# Altium footprint library HW_HOLLAND_NCDM_MONITOR_R1.PcbLib: 472 footprints (part 20 of 30)
Each footprint in its own frame and in the unit in brackets; x right, y up, seen from the top. Pads: shape width x height; smd on the part's side, far side on the other; paste and mask are expansions set on the pad; w line width, h text height; cw(c..) or ccw(c..) is an arc to the next point about the centre after c.
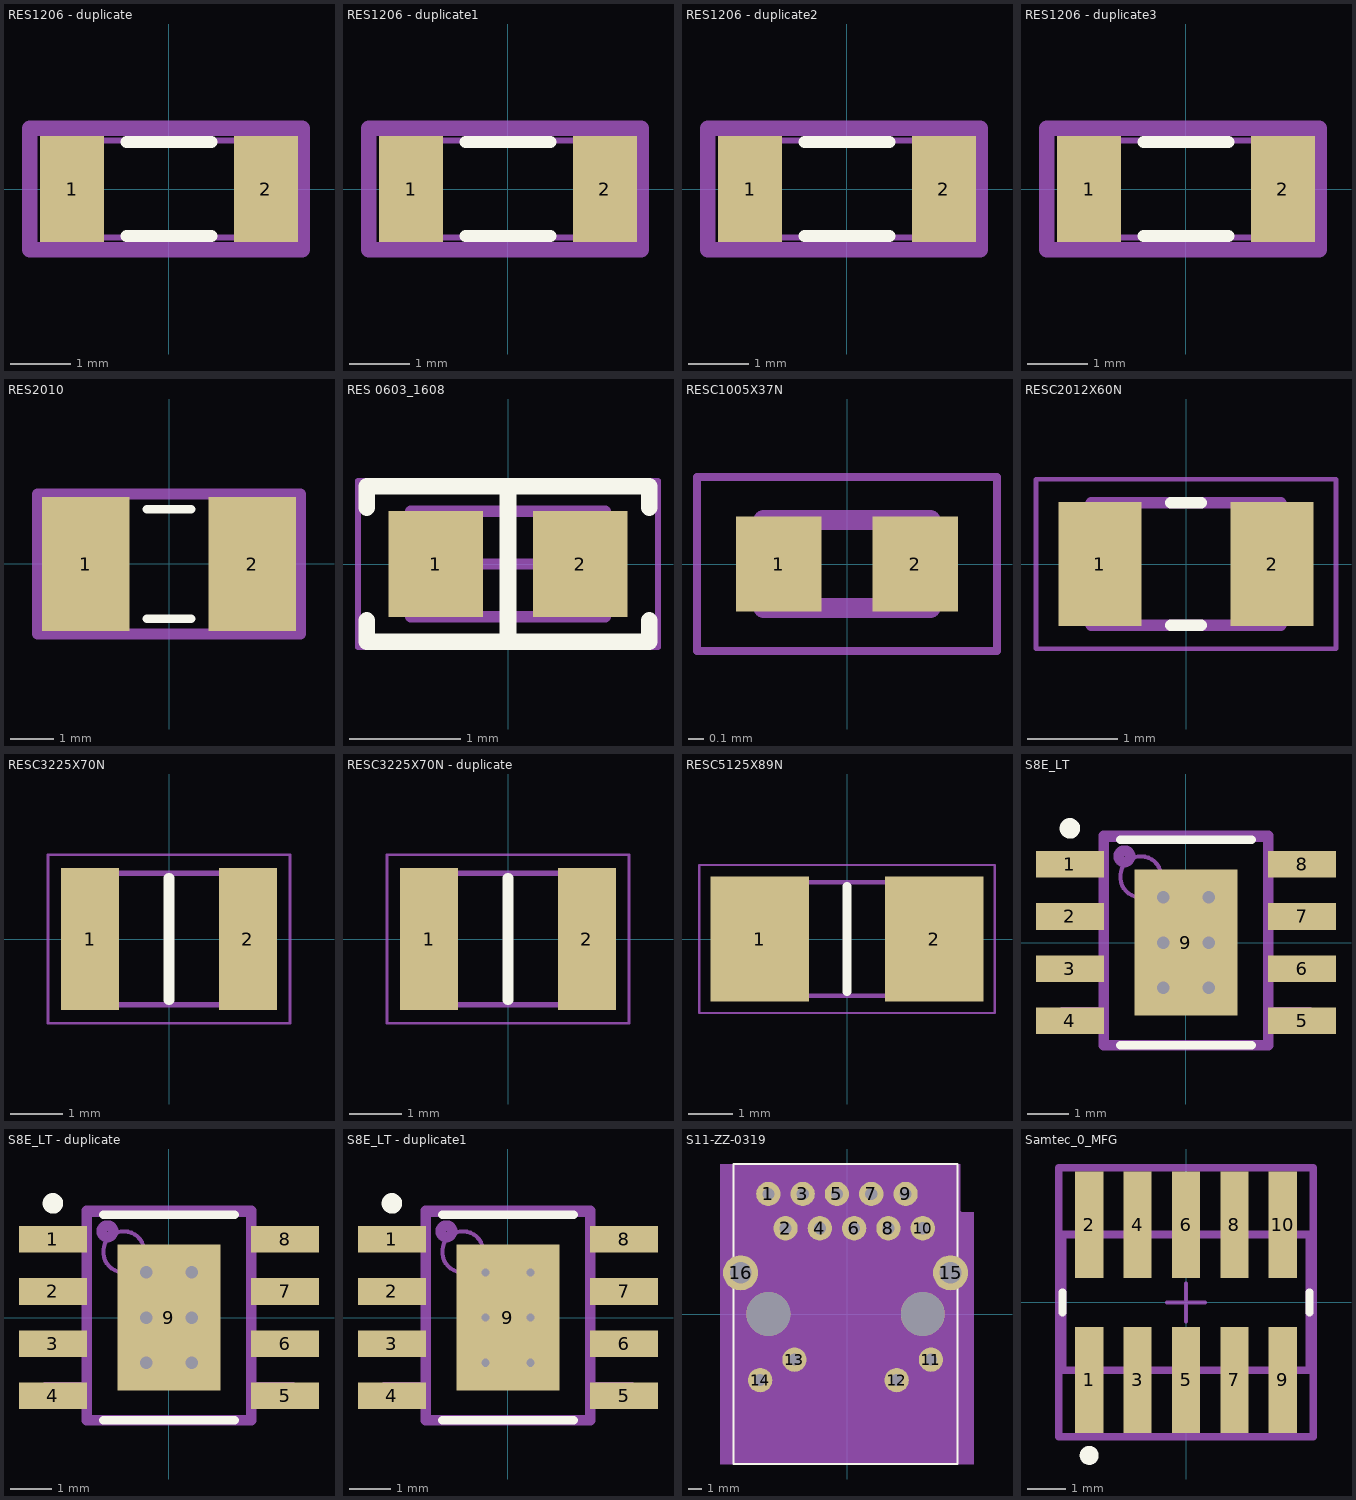
[diagram p19: the footprints below, top view; thin cyan lines are the x and y axes]

## RES1206 - duplicate [mm]
height 3.5
pads (2):
  rect 1.05x1.75 smd: 1(-1.6,0) 2(1.6,0)
Top Overlay:
  lines w0.2: -0.7,-0.775 0.7,-0.775 ; -0.7,0.775 0.7,0.775
Top 3D Body:
  lines w0.1: -1.55,-0.8 1.55,-0.8 1.55,0.8 -1.55,0.8 -1.55,-0.8
Top Designator:
  lines w0.254: -2.3,-1 2.2,-1 2.2,1 -2.3,1 -2.3,-1
  text ".Designator" at -5.078,-0.339 h1.02
3D body "RES1206.step": height 0.55, standoff 0, extent -1.55,-0.8 1.55,0.8

## RES1206 - duplicate1 [mm]
pads (2):
  rect 1.05x1.75 smd: 1(-1.6,0) 2(1.6,0)
Top Overlay:
  lines w0.2: -0.7,-0.775 0.7,-0.775 ; -0.7,0.775 0.7,0.775
Top 3D Body:
  lines w0.1: -1.55,-0.8 -1.55,0.8 1.55,0.8 1.55,-0.8 -1.55,-0.8
Top Designator:
  lines w0.254: -2.3,-1 -2.3,1 2.2,1 2.2,-1 -2.3,-1
  text ".Designator" at -5.078,-0.339 h1.02
3D body "RES1206.step": height 0.55, standoff 0, extent -1.55,-0.8 1.55,0.8

## RES1206 - duplicate2 [mm]
height 3.5
pads (2):
  rect 1.05x1.75 smd: 1(-1.6,0) 2(1.6,0)
Top Overlay:
  lines w0.2: -0.7,-0.775 0.7,-0.775 ; -0.7,0.775 0.7,0.775
Top 3D Body:
  lines w0.1: -1.55,-0.8 1.55,-0.8 1.55,0.8 -1.55,0.8 -1.55,-0.8
Top Designator:
  lines w0.254: -2.3,-1 2.2,-1 2.2,1 -2.3,1 -2.3,-1
  text ".Designator" at -5.078,-0.339 h1.02
3D body "RES1206.step": height 0.55, standoff 0, extent -1.55,-0.8 1.55,0.8

## RES1206 - duplicate3 [mm]
pads (2):
  rect 1.05x1.75 smd: 1(-1.6,0) 2(1.6,0)
Top Overlay:
  lines w0.2: -0.7,-0.775 0.7,-0.775 ; -0.7,0.775 0.7,0.775
Top 3D Body:
  lines w0.1: -1.55,-0.8 -1.55,0.8 1.55,0.8 1.55,-0.8 -1.55,-0.8
Top Designator:
  lines w0.254: -2.3,-1 -2.3,1 2.2,1 2.2,-1 -2.3,-1
  text ".Designator" at -2.812,-0.282 h1.25
3D body "RES1206.step": height 0.55, standoff 0, extent -1.55,-0.8 1.55,0.8

## RES2010 [mm]
pads (2):
  rect 2x3.05 smd: 1(-1.9,0) 2(1.9,0)
Top Overlay:
  lines w0.2: -0.5,-1.25 0.5,-1.25 ; -0.5,1.25 0.5,1.25
Top Designator:
  lines w0.254: -3,-1.6 3,-1.6 3,1.6 -3,1.6 -3,-1.6
  text ".Designator" at -2.812,-0.282 h1.25
3D body "WSLP2010 (0.001 to 0.0069).STEP": height 0.66, standoff 0, extent -2.54,-1.27 2.54,1.27

## RES 0603_1608 [mm] "Chip Resistor, 2-Leads, Body 1.60x0.80mm, IPC Medium Density"
height 0.45
pads (2):
  rect 0.85x0.95 smd: 1(-0.65,0) 2(0.65,0)
Top Overlay:
  lines w0.15: -1.27,-0.508 -1.27,-0.7 1.27,-0.7 1.27,-0.508 ; -1.27,0.508 -1.27,0.7 1.27,0.7 1.27,0.508 ; 0,-0.7 0,0.7
Mechanical 13:
  lines w0.1: -0.875,-0.475 0.875,-0.475 0.875,0.475 -0.875,0.475 -0.875,-0.475
Mechanical 15:
  lines w0.05: -1.35,-0.75 1.35,-0.75 1.35,0.75 -1.35,0.75 -1.35,-0.75
  lines w0.1: -0.475,0 0.475,0 ; 0,-0.475 0,0.475
3D body "0603 resistor.STEP": height 0.45, standoff 0, extent -0.8,-0.4 0.8,0.4

## RESC1005X37N [mm]
pads (2):
  rect 0.54x0.6 smd: 1(-0.432,0) 2(0.432,0)
Mechanical 13:
  lines w0.127: -0.53,-0.28 -0.53,0.28 0.53,0.28 0.53,-0.28 -0.53,-0.28
Mechanical 15:
  lines w0.05: -0.95,-0.55 -0.95,0.55 0.95,0.55 0.95,-0.55 -0.95,-0.55
3D body "step_temp.STEP": height 0.37, standoff 0, extent -0.5,-0.25 0.5,0.25

## RESC2012X60N [mm]
pads (2):
  rect 0.92x1.38 smd: 1(-0.955,0) 2(0.955,0)
Top Overlay:
  lines w0.127: -0.17,-0.68 0.17,-0.68 ; -0.17,0.68 0.17,0.68
Mechanical 13:
  lines w0.127: -1.05,-0.68 -1.05,0.68 1.05,0.68 1.05,-0.68 -1.05,-0.68
Mechanical 15:
  lines w0.05: -1.665,-0.94 -1.665,0.94 1.665,0.94 1.665,-0.94 -1.665,-0.94
3D body "RT0805BRD0711K7L.STEP": height 0.61, standoff 0.01, extent -1,-0.625 1,0.625

## RESC3225X70N [mm]
pads (2):
  rect 1.1x2.7 smd: 1(-1.5,0) 2(1.5,0)
Top Overlay:
  lines w0.2: 0,-1.15 0,1.15
Mechanical 13:
  lines w0.1: -1.6,-1.25 -1.6,1.25 1.6,1.25 1.6,-1.25 -1.6,-1.25
Mechanical 15:
  lines w0.05: -2.3,-1.6 -2.3,1.6 2.3,1.6 2.3,-1.6 -2.3,-1.6
3D body "CRCW12100000Z0EAHP.stp": height 0.7, standoff 0, extent -1.6,-1.25 1.6,1.25

## RESC3225X70N - duplicate [mm]
pads (2):
  rect 1.1x2.7 smd: 1(-1.5,0) 2(1.5,0)
Top Overlay:
  lines w0.2: 0,-1.15 0,1.15
Mechanical 13:
  lines w0.1: -1.6,-1.25 -1.6,1.25 1.6,1.25 1.6,-1.25 -1.6,-1.25
Mechanical 15:
  lines w0.05: -2.3,-1.6 -2.3,1.6 2.3,1.6 2.3,-1.6 -2.3,-1.6
3D body "CRCW12100000Z0EAHP.stp": height 0.7, standoff 0, extent -1.6,-1.25 1.6,1.25

## RESC5125X89N [mm]
pads (2):
  rect 2.2x2.8 smd: 1(-1.95,0) 2(1.95,0)
Top Overlay:
  lines w0.2: 0,-1.17 0,1.17
Mechanical 13:
  lines w0.1: -2.54,-1.27 2.54,-1.27 2.54,1.27 -2.54,1.27 -2.54,-1.27
Mechanical 15:
  lines w0.05: -3.3,-1.65 3.3,-1.65 3.3,1.65 -3.3,1.65 -3.3,-1.65
3D body "WSLP20102L500FEA.stp": height 0.67, standoff 0.01, extent -2.54,-1.27 2.54,1.27

## S8E_LT [mm]
pads (9):
  rect 1.65x0.65 smd: 1(-2.825,1.905) 2(-2.825,0.635) 3(-2.825,-0.635) 4(-2.825,-1.905) 5(2.825,-1.905) 6(2.825,-0.635) 7(2.825,0.635) 8(2.825,1.905)
  rect 2.5x3.55 smd: 9(0,0)
via 0.55,-1.1 diameter 0.508 hole 0.305
via -0.55,-1.1 diameter 0.508 hole 0.305
via 0.55,0 diameter 0.508 hole 0.305
via -0.55,0 diameter 0.508 hole 0.305
via 0.55,1.1 diameter 0.508 hole 0.305
via -0.55,1.1 diameter 0.508 hole 0.305
Top Overlay:
  circle w0.25: c-2.825,2.78 r0.125
  lines w0.2: -1.6,-2.5 1.6,-2.5 ; -1.6,2.5 1.6,2.5
Top 3D Body:
  circle w0.1: c-1.1,1.6 r0.5
  lines w0.1: -2,-2.5 2,-2.5 2,2.5 -2,2.5 -2,-2.5
Top Designator:
  circle w0.254: c-1.5,2.1 r0.141
  lines w0.254: -2,-2 -3,-2 -3,-1.7 -2,-1.7 ; -2,-0.8 -3,-0.8 -3,-0.5 -2,-0.5 ; -2,0.5 -3,0.5 -3,0.8 -2,0.8 ; -2,1.8 -3,1.8 -3,2.1 -2,2.1 ; 2,-2 3,-2 3,-1.7 2,-1.7 ; 2,-0.8 3,-0.8 3,-0.5 2,-0.5 ; 2,0.5 3,0.5 3,0.8 2,0.8 ; 2,1.8 3,1.8 3,2.1 2,2.1 ; -2,-2.5 -2,2.6 2,2.6 2,-2.5 -2,-2.5
  text ".Designator" at -0.423,6.348 h1.27
3D body "SOIC8-150-50.STEP": height 1.91, standoff 0, extent -3,-2.45 3,2.45

## S8E_LT - duplicate [mm]
pads (9):
  rect 1.65x0.65 smd: 1(-2.825,1.905) 2(-2.825,0.635) 3(-2.825,-0.635) 4(-2.825,-1.905) 5(2.825,-1.905) 6(2.825,-0.635) 7(2.825,0.635) 8(2.825,1.905)
  rect 2.5x3.55 smd: 9(0,0)
via 0.55,-1.1 diameter 0.508 hole 0.305
via -0.55,-1.1 diameter 0.508 hole 0.305
via 0.55,0 diameter 0.508 hole 0.305
via -0.55,0 diameter 0.508 hole 0.305
via 0.55,1.1 diameter 0.508 hole 0.305
via -0.55,1.1 diameter 0.508 hole 0.305
Top Overlay:
  circle w0.25: c-2.825,2.78 r0.125
  lines w0.2: -1.6,-2.5 1.6,-2.5 ; -1.6,2.5 1.6,2.5
Top 3D Body:
  circle w0.1: c-1.1,1.6 r0.5
  lines w0.1: -2,-2.5 2,-2.5 2,2.5 -2,2.5 -2,-2.5
Top Designator:
  circle w0.254: c-1.5,2.1 r0.141
  lines w0.254: -2,-2 -3,-2 -3,-1.7 -2,-1.7 ; -2,-0.8 -3,-0.8 -3,-0.5 -2,-0.5 ; -2,0.5 -3,0.5 -3,0.8 -2,0.8 ; -2,1.8 -3,1.8 -3,2.1 -2,2.1 ; 2,-2 3,-2 3,-1.7 2,-1.7 ; 2,-0.8 3,-0.8 3,-0.5 2,-0.5 ; 2,0.5 3,0.5 3,0.8 2,0.8 ; 2,1.8 3,1.8 3,2.1 2,2.1 ; -2,-2.5 -2,2.6 2,2.6 2,-2.5 -2,-2.5
  text ".Designator" at -0.423,6.348 h1.27
3D body "SOIC8-150-50.STEP": height 1.91, standoff 0, extent -3,-2.45 3,2.45

## S8E_LT - duplicate1 [mm]
height 0.52
pads (9):
  rect 1.65x0.65 smd: 1(-2.825,1.905) 2(-2.825,0.635) 3(-2.825,-0.635) 4(-2.825,-1.905) 5(2.825,-1.905) 6(2.825,-0.635) 7(2.825,0.635) 8(2.825,1.905)
  rect 2.5x3.55 smd: 9(0,0)
via -0.55,1.1 diameter 0.5 hole 0.2
via 0.55,1.1 diameter 0.5 hole 0.2
via -0.55,0 diameter 0.5 hole 0.2
via 0.55,0 diameter 0.5 hole 0.2
via -0.55,-1.1 diameter 0.5 hole 0.2
via 0.55,-1.1 diameter 0.5 hole 0.2
Top Overlay:
  circle w0.25: c-2.825,2.78 r0.125
  lines w0.2: -1.6,-2.5 1.6,-2.5 ; -1.6,2.5 1.6,2.5
Top 3D Body:
  circle w0.1: c-1.1,1.6 r0.5
  lines w0.1: -2,-2.5 -2,2.5 2,2.5 2,-2.5 -2,-2.5
Top Designator:
  circle w0.254: c-1.5,2.1 r0.141
  lines w0.254: -2,-2 -3,-2 -3,-1.7 -2,-1.7 ; -2,-0.8 -3,-0.8 -3,-0.5 -2,-0.5 ; -2,0.5 -3,0.5 -3,0.8 -2,0.8 ; -2,1.8 -3,1.8 -3,2.1 -2,2.1 ; 2,-2 3,-2 3,-1.7 2,-1.7 ; 2,-0.8 3,-0.8 3,-0.5 2,-0.5 ; 2,0.5 3,0.5 3,0.8 2,0.8 ; 2,1.8 3,1.8 3,2.1 2,2.1 ; -2,-2.5 2,-2.5 2,2.6 -2,2.6 -2,-2.5
  text ".Designator" at -0.423,6.348 h1.27
3D body "S8E_LT.step": height 1.8, standoff 0, extent -3,-2.5 3,2.5

## S11-ZZ-0319 [mm]
pads (18):
  round 1.8 hole 0.9: 1(-5.822,8.895) 2(-4.552,6.355) 3(-3.282,8.895) 4(-2.012,6.355) 5(-0.742,8.895) 6(0.528,6.355) 7(1.798,8.895) 8(3.068,6.355) 9(4.338,8.895) 10(5.608,6.355) 11(6.218,-3.375) 12(3.678,-4.895) 13(-3.892,-3.375) 14(-6.432,-4.895)
  round 2.6 hole 1.6: 15(7.668,3.055) 16(-7.882,3.055)
  round 3.25 hole 3.25 unplated: ""(-5.822,0.005) ""(5.608,0.005)
Top Overlay:
  lines w0.152: -8.407,-11.105 -8.407,11.115 8.193,11.115 8.193,-11.105 -8.407,-11.105
  text ".Designator" at -1.06,-0.212 h0.64
Top Assembly:
  lines w0.025: -8.407,-11.105 8.193,-11.105 8.193,11.115 -8.407,11.115 -8.407,-11.105
Top 3D Body:
  region: -9.393,-11.105 9.393,-11.105 9.393,7.541 8.514,7.541 8.387,7.668 8.387,11.105 -9.393,11.105
Mechanical 17:
  text "10" at 5.307,6.045 h0.46
  text "9" at 4.402,8.585 h0.46
  text "8" at 3.132,6.045 h0.46
  text "7" at 1.862,8.585 h0.46
  text "4" at -1.948,6.045 h0.46
  text "3" at -3.218,8.585 h0.46
  text "2" at -4.488,6.045 h0.46
  text "1" at -5.758,8.585 h0.46
  text "13" at -4.194,-3.685 h0.46
  text "5" at -0.678,8.585 h0.46
  text "6" at 0.592,6.045 h0.46
  text "11" at 5.916,-3.685 h0.46
  text "16" at -8.183,2.745 h0.46
  text "15" at 7.367,2.745 h0.46
  text "12" at 3.376,-5.205 h0.46
  text "14" at -6.734,-5.205 h0.46
3D body: height 3.81, standoff 0, extent -9.393,-11.105 9.393,11.105

## Samtec_0_MFG [mm]
pads (10):
  rect 0.74x2.79 smd paste+0 mask+0: 1(-2.54,-2.035) 2(-2.54,2.035) 3(-1.27,-2.035) 4(-1.27,2.035) 5(0,-2.035) 6(0,2.035) 7(1.27,-2.035) 8(1.27,2.035) 9(2.54,-2.035) 10(2.54,2.035)
Top Overlay:
  circle w0.25: c-2.54,-4.015 r0.125
  lines w0.2: -3.24,-0.265 -3.24,0.265 ; 3.24,-0.265 3.24,0.265
Top Courtyard:
  lines w0.2: -3.34,-3.53 3.34,-3.53 3.34,3.53 -3.34,3.53 -3.34,-3.53
  text ".Designator" at 0,0.046 h1.25
Mechanical 12:
  lines w0.2: -3.24,-1.78 3.24,-1.78 3.24,1.78 -3.24,1.78 -3.24,-1.78
Mechanical 15:
  lines w0.1: -0.5,0 0.5,0 ; 0,-0.5 0,0.5
  lines w0.2: -3.34,-3.53 3.34,-3.53 3.34,3.53 -3.34,3.53 -3.34,-3.53
3D body "Conn_Samtec_FTSH-105-01-F-DV-K-P-TR_eec.STEP": height 0.25, standoff 0, extent -3.34,-3.53 3.34,3.53